# Altium footprint library LimeMicroAltiumLib_pcbLib_r01.PcbLib: 434 footprints (part 20 of 29)
Each footprint in its own frame and in the unit in brackets; x right, y up, seen from the top. Pads: shape width x height; smd on the part's side, far side on the other; paste and mask are expansions set on the pad; w line width, h text height; cw(c..) or ccw(c..) is an arc to the next point about the centre after c.
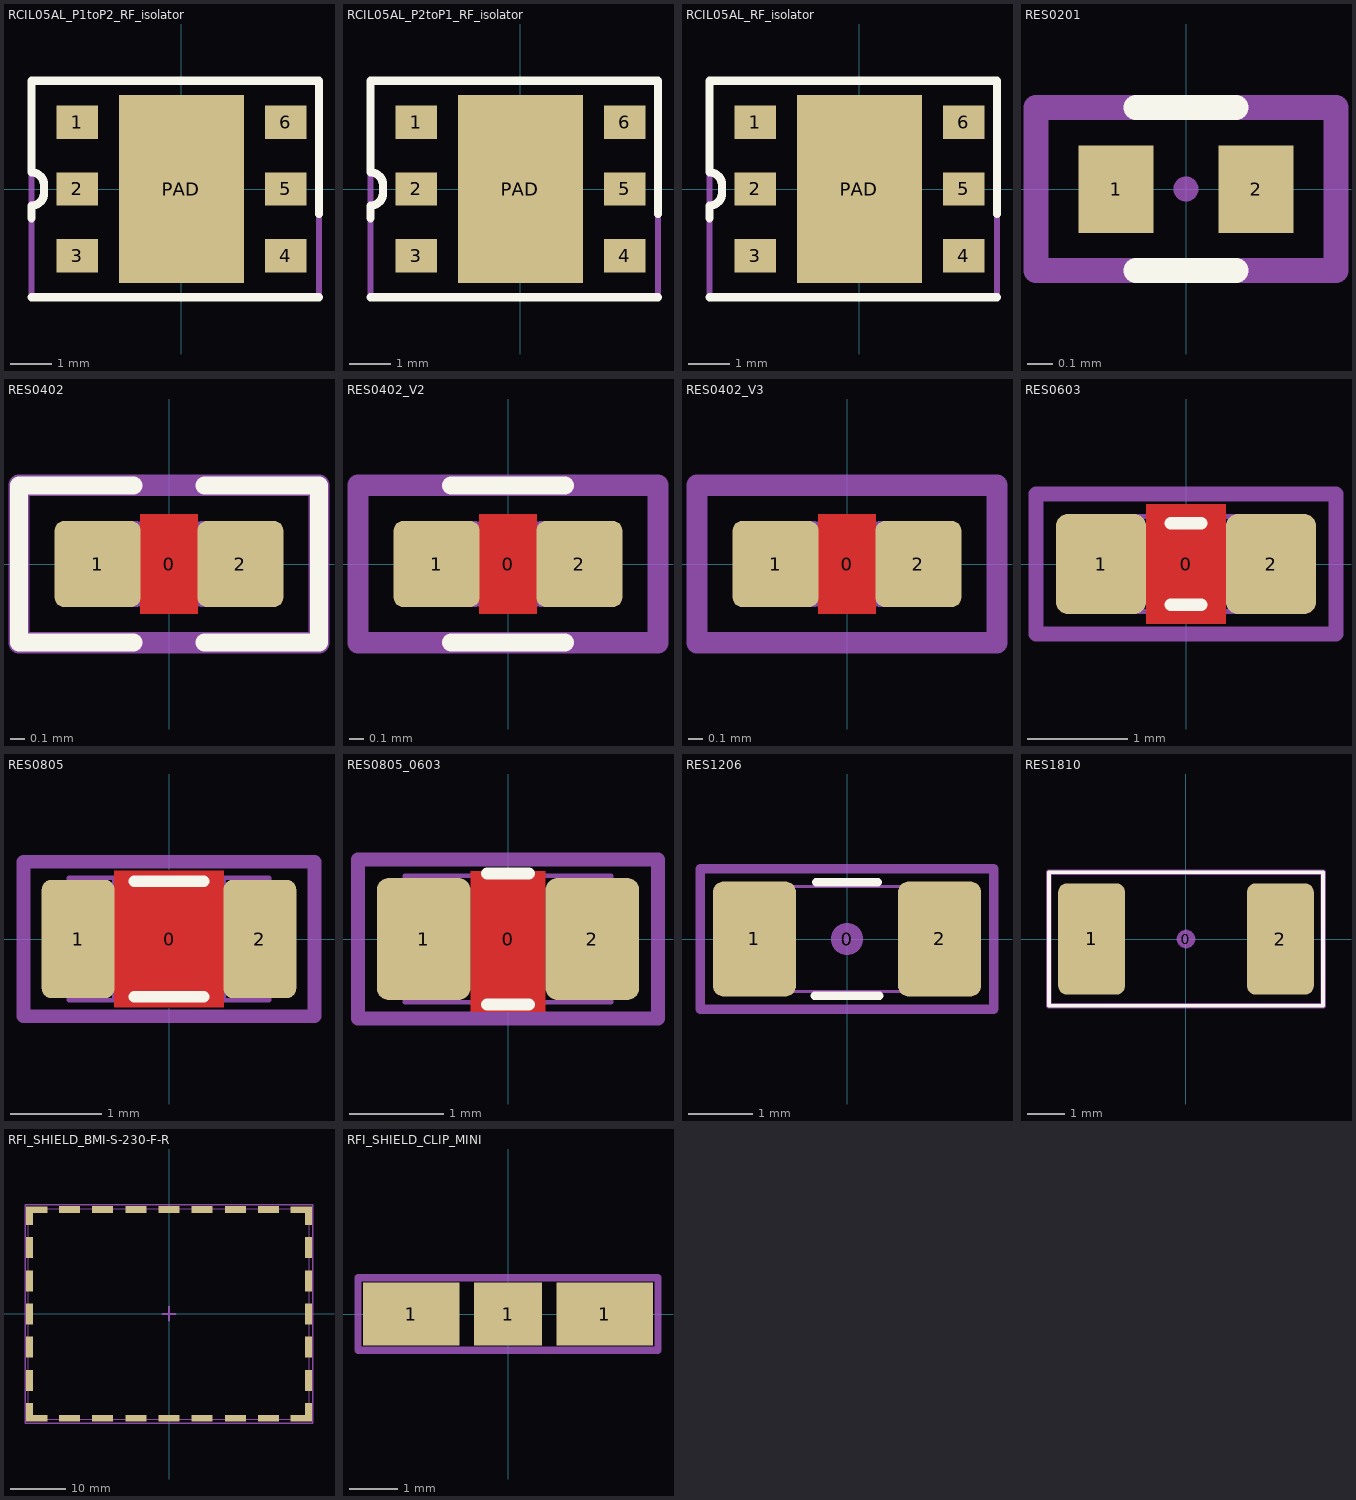
[diagram p19: the footprints below, top view; thin cyan lines are the x and y axes]

## RCIL05AL_P1toP2_RF_isolator [mm]
pads (7):
  rect 1x0.8 smd mask+0.05: 1(-2.5,1.6) 2(-2.5,0) 3(-2.5,-1.6) 4(2.5,-1.6) 5(2.5,0) 6(2.5,1.6)
  rect 3x4.5 smd mask+0.05: PAD(0,0)
Top Overlay:
  lines w0.2: -3.6,-2.6 3.3,-2.6 ; -3.6,-0.7 -3.6,-0.4 ccw(c-3.6,-0.1) -3.3,-0.1 -3.3,0.1 ccw(c-3.6,0.1) -3.6,0.4 -3.6,2.6 3.3,2.6 3.3,-0.6
Mechanical 15:
  lines w0.15: -0.9,-1.5 0.75,-1.5 ; -0.5,0 0.5,0 ; 0,-0.5 0,0.5 ; 0.25,-1.75 0.75,-1.5 ; 0.25,-1.25 0.75,-1.5 ; -3.6,-2.6 -3.6,2.6 3.3,2.6 3.3,-2.6 -3.6,-2.6
  text ".Designator" at 0,0 h0.55
  text "G" at -1.9,1.3 h0.55
  text "G" at -1.9,-0.3 h0.55
  text "P1" at -1.9,-1.8 h0.55
  text "P2" at 1,-1.8 h0.55
  text "G" at 1.5,-0.3 h0.55
  text "G" at 1.5,1.3 h0.55
3D body: height 2.3, standoff 0, extent -2.5,-2.5 2.5,2.5

## RCIL05AL_P2toP1_RF_isolator [mm]
pads (7):
  rect 1x0.8 smd mask+0.05: 1(-2.5,1.6) 2(-2.5,0) 3(-2.5,-1.6) 4(2.5,-1.6) 5(2.5,0) 6(2.5,1.6)
  rect 3x4.5 smd mask+0.05: PAD(0,0)
Top Overlay:
  lines w0.2: -3.6,-2.6 3.3,-2.6 ; -3.6,-0.7 -3.6,-0.4 ccw(c-3.6,-0.1) -3.3,-0.1 -3.3,0.1 ccw(c-3.6,0.1) -3.6,0.4 -3.6,2.6 3.3,2.6 3.3,-0.6
Mechanical 15:
  lines w0.15: -0.5,0 0.5,0 ; -0.4,-1.75 -0.9,-1.5 ; -0.4,-1.25 -0.9,-1.5 ; 0,-0.5 0,0.5 ; 0.75,-1.5 -0.9,-1.5 ; -3.6,-2.6 -3.6,2.6 3.3,2.6 3.3,-2.6 -3.6,-2.6
  text ".Designator" at 0,0 h0.55
  text "G" at -1.9,1.3 h0.55
  text "G" at -1.9,-0.3 h0.55
  text "P1" at -1.9,-1.8 h0.55
  text "P2" at 1,-1.8 h0.55
  text "G" at 1.5,-0.3 h0.55
  text "G" at 1.5,1.3 h0.55
3D body: height 2.3, standoff 0, extent -2.5,-2.575 2.5,2.575

## RCIL05AL_RF_isolator [mm]
pads (7):
  rect 1x0.8 smd mask+0.05: 1(-2.5,1.6) 2(-2.5,0) 3(-2.5,-1.6) 4(2.5,-1.6) 5(2.5,0) 6(2.5,1.6)
  rect 3x4.5 smd mask+0.05: PAD(0,0)
Top Overlay:
  lines w0.2: -3.6,-2.6 3.3,-2.6 ; -3.6,-0.7 -3.6,-0.4 ccw(c-3.6,-0.1) -3.3,-0.1 -3.3,0.1 ccw(c-3.6,0.1) -3.6,0.4 -3.6,2.6 3.3,2.6 3.3,-0.6
Mechanical 15:
  lines w0.15: -0.5,0 0.5,0 ; 0,-0.5 0,0.5 ; -3.6,-2.6 3.3,-2.6 3.3,2.6 -3.6,2.6 -3.6,-2.6
  text "G" at 1.5,1.3 h0.55
  text "G" at 1.5,-0.3 h0.55
  text "P2" at 1,-1.8 h0.55
  text "P1" at -1.9,-1.8 h0.55
  text "G" at -1.9,-0.3 h0.55
  text "G" at -1.9,1.3 h0.55
  text ".Designator" at 0,0 h0.55
3D body: height 2.3, standoff 0, extent -2.5,-2.5 2.5,2.5

## RES0201 [mm]
pads (2):
  rect 0.3x0.35 smd mask+0.05: 1(-0.28,0) 2(0.28,0)
Top Overlay:
  lines w0.1: -0.2,-0.325 0.2,-0.325 ; -0.2,0.325 0.2,0.325
Mechanical 15:
  circle w0.05: c0,0 r0.025
  lines w0.1: -0.6,-0.325 -0.6,0.325 0.6,0.325 0.6,-0.325 -0.6,-0.325
  text ".Designator" at 0.025,0 h0.55
3D body: height 0.25, standoff 0, extent 0.17,-0.15 0.3,0.15
3D body: height 0.25, standoff 0, extent -0.3,-0.15 -0.17,0.15
3D body: height 0.25, standoff 0, extent -0.17,-0.15 0.17,0.15

## RES0402 [mm] "Chip Resistor, Body 1.0x0.5mm, EIA 0402, IPC Medium Density"
height 0.4
pads (3):
  round 0.2 on Mech15: 0(0,0)
  rrect20% 0.6x0.6 smd: 1(-0.5,0) 2(0.5,0)
Top Layer:
  pour cut-out: -0.2,0.35 0.2,0.35 0.2,-0.35 -0.2,-0.35
Top Overlay:
  lines w0.127: -0.25,-0.55 -1.05,-0.55 -1.05,0.55 -0.25,0.55 ; 0.25,-0.55 1.05,-0.55 1.05,0.55 0.25,0.55
Mechanical 13:
  lines w0.05: 0.225,-0.274 -0.225,-0.274 0.225,-0.274 ; -0.525,-0.275 -0.225,-0.275 -0.225,0.275 -0.525,0.275 -0.525,-0.275 ; -0.225,0.274 0.225,0.274 -0.225,0.274 ; 0.225,-0.275 0.225,0.275 0.525,0.275 0.525,-0.275 0.225,-0.275
Mechanical 15:
  lines w0.15: -1.05,-0.55 1.05,-0.55 1.05,0.55 -1.05,0.55 -1.05,-0.55
  text ".Designator" at 0,0 h0.55
3D body "RES 0402 (1005 metric).STEP": height 0.4, standoff 0, extent -0.525,-0.275 0.525,0.275

## RES0402_V2 [mm] "Chip Resistor, Body 1.0x0.5mm, EIA 0402, IPC Medium Density"
height 0.4
pads (3):
  round 0.2 on Mech15: 0(0,0)
  rrect20% 0.6x0.6 smd: 1(-0.5,0) 2(0.5,0)
Top Layer:
  pour cut-out: -0.2,0.35 0.2,0.35 0.2,-0.35 -0.2,-0.35
Top Overlay:
  lines w0.127: -0.4,-0.55 0.4,-0.55 ; -0.4,0.55 0.4,0.55
Mechanical 13:
  lines w0.05: 0.225,-0.274 -0.225,-0.274 0.225,-0.274 ; -0.525,-0.275 -0.225,-0.275 -0.225,0.275 -0.525,0.275 -0.525,-0.275 ; -0.225,0.274 0.225,0.274 -0.225,0.274 ; 0.225,-0.275 0.225,0.275 0.525,0.275 0.525,-0.275 0.225,-0.275
Mechanical 15:
  lines w0.15: -1.05,-0.55 1.05,-0.55 1.05,0.55 -1.05,0.55 -1.05,-0.55
  text ".Designator" at 0,0 h0.55
3D body "RES 0402 (1005 metric).STEP": height 0.4, standoff 0, extent -0.525,-0.275 0.525,0.275

## RES0402_V3 [mm] "Chip Resistor, Body 1.0x0.5mm, EIA 0402, IPC Medium Density"
height 0.4
pads (3):
  round 0.2 on Mech15: 0(0,0)
  rrect20% 0.6x0.6 smd: 1(-0.5,0) 2(0.5,0)
Top Layer:
  pour cut-out: -0.2,0.35 0.2,0.35 0.2,-0.35 -0.2,-0.35
Mechanical 13:
  lines w0.05: 0.225,-0.274 -0.225,-0.274 0.225,-0.274 ; -0.525,-0.275 -0.525,0.275 -0.225,0.275 -0.225,-0.275 -0.525,-0.275 ; -0.225,0.274 0.225,0.274 -0.225,0.274 ; 0.225,-0.275 0.525,-0.275 0.525,0.275 0.225,0.275 0.225,-0.275
Mechanical 15:
  lines w0.15: -1.05,-0.55 -1.05,0.55 1.05,0.55 1.05,-0.55 -1.05,-0.55
  text ".Designator" at 0,0 h0.55
3D body "RES 0402 (1005 metric).STEP": height 0.4, standoff 0, extent -0.525,-0.275 0.525,0.275

## RES0603 [mm] "Chip Resistor, Body 1.6x0.8mm, 0603, IPC Medium Density"
height 0.55
pads (3):
  round 0.254 on Mech15: 0(0,0)
  rrect25% 0.9x1 smd: 1(-0.85,0) 2(0.85,0)
Top Layer:
  pour cut-out: -0.4,0.6 0.4,0.6 0.4,-0.6 -0.4,-0.6
Top Overlay:
  lines w0.127: -0.152,-0.406 0.152,-0.406 ; -0.152,0.406 0.152,0.406
Mechanical 13:
  lines w0.05: -0.875,-0.475 -0.875,0.475 -0.475,0.475 -0.475,-0.475 -0.875,-0.475 ; -0.475,-0.474 0.475,-0.474 -0.475,-0.474 ; -0.475,0.474 0.475,0.474 -0.475,0.474 ; 0.475,-0.475 0.875,-0.475 0.875,0.475 0.475,0.475 0.475,-0.475
Mechanical 15:
  lines w0.15: -1.5,-0.7 1.5,-0.7 1.5,0.7 -1.5,0.7 -1.5,-0.7
  text ".Designator" at 0,0 h0.55
3D body "RES 0603 (1608 metric).STEP": height 0.54, standoff -0.01, extent -0.875,-0.475 0.875,0.475

## RES0805 [mm] "Chip Resistor, Body 2.0x1.2mm, 0805, IPC Medium Density"
height 0.7
pads (3):
  round 0.254 on Mech15: 0(0,0)
  rrect25% 0.8x1.3 smd: 1(-1,0) 2(1,0)
Top Layer:
  pour cut-out: -0.6,0.75 0.6,0.75 0.6,-0.75 -0.6,-0.75
Top Overlay:
  lines w0.127: -0.381,-0.635 0.381,-0.635 ; -0.381,0.635 0.381,0.635
Mechanical 13:
  lines w0.05: 0.6,-0.674 -0.6,-0.674 ; -0.6,-0.674 0.6,-0.674 ; -0.6,-0.675 -1.1,-0.675 -1.1,0.675 -0.6,0.675 -0.6,-0.675 ; 0.6,-0.675 1.1,-0.675 1.1,0.675 0.6,0.675 ; 0.6,-0.675 0.6,0.675 ; 0.6,0.674 -0.6,0.674 0.6,0.674
Mechanical 15:
  lines w0.15: -1.6,-0.85 -1.6,0.85 1.6,0.85 1.6,-0.85 -1.6,-0.85
  text ".Designator" at 0,0 h0.55
3D body "RES 0805 (2012 metric).STEP": height 0.69, standoff -0.01, extent -1.1,-0.675 1.1,0.675

## RES0805_0603 [mm] "Universal 0805 0603 footprint"
height 0.7
pads (3):
  round 0.254 on Mech15: 0(0,0)
  rrect25% 1x1.3 smd: 1(-0.9,0) 2(0.9,0)
Top Layer:
  pour cut-out: -0.4,0.725 0.4,0.725 0.4,-0.775 -0.4,-0.775
Top Overlay:
  lines w0.127: -0.225,-0.7 0.225,-0.7 ; -0.225,0.7 0.225,0.7
Mechanical 13:
  lines w0.05: 0.6,-0.674 -0.6,-0.674 ; -0.6,-0.674 0.6,-0.674 ; -0.6,-0.675 -1.1,-0.675 -1.1,0.675 -0.6,0.675 -0.6,-0.675 ; 0.6,-0.675 1.1,-0.675 1.1,0.675 0.6,0.675 ; 0.6,-0.675 0.6,0.675 ; 0.6,0.674 -0.6,0.674 0.6,0.674
Mechanical 15:
  lines w0.15: -1.6,-0.85 -1.6,0.85 1.6,0.85 1.6,-0.85 -1.6,-0.85
  text ".Designator" at 0,0 h0.55
3D body "RES 0805 (2012 metric).STEP": height 0.69, standoff -0.01, extent -1.1,-0.675 1.1,0.675

## RES1206 [mm] "Chip Resistor, Body 3.2x1.6mm, 1206, IPC Medium Density"
height 0.7
pads (3):
  round 0.508 on Mech15: 0(0,0)
  rrect25% 1.3x1.8 smd: 1(-1.45,0) 2(1.45,0)
Top Overlay:
  lines w0.127: -0.508,-0.889 0.508,-0.889 ; -0.483,0.889 0.483,0.889
Mechanical 13:
  lines w0.05: 1.025,-0.824 -1.025,-0.824 1.025,-0.824 ; -1.625,-0.825 -1.625,0.825 -1.025,0.825 -1.025,-0.825 -1.625,-0.825 ; -1.025,0.824 1.025,0.824 -1.025,0.824 ; 1.025,-0.825 1.625,-0.825 1.625,0.825 1.025,0.825 1.025,-0.825
Mechanical 15:
  lines w0.15: -2.3,-1.1 2.3,-1.1 2.3,1.1 -2.3,1.1 -2.3,-1.1
  text ".Designator" at 0,0 h0.55
3D body "RES 1206 (3216 metric).STEP": height 0.69, standoff -0.01, extent -1.625,-0.825 1.625,0.825

## RES1810 [mm]
height 0.7
pads (3):
  round 0.508 on Mech15: 0(0,0)
  rrect25% 1.8x3 smd: 1(-2.55,0) 2(2.55,0)
Top Overlay:
  lines w0.1: -3.7,-1.8 3.7,-1.8 3.7,1.8 -3.7,1.8 -3.7,-1.8
Mechanical 15:
  lines w0.15: -3.7,-1.8 -3.7,1.8 3.7,1.8 3.7,-1.8 -3.7,-1.8
  text ".Designator" at 0,0 h0.55
3D body: height 2.55, standoff 0, extent -2.3,-1.3 -1.4,1.3
3D body: height 2.5, standoff 0, extent -2.25,-1.25 2.25,1.25
3D body: height 2.55, standoff 0, extent 1.4,-1.3 2.3,1.3

## RFI_SHIELD_21.2x21.2 [mm] "RFI SHIELD 36003200"
height 3
3D body: height 3, standoff 0, extent 0.225,21.55 21.538,22.075
3D body: height 3, standoff 0, extent 21.538,-0.25 22.063,22.075
3D body: height 3, standoff 0, extent -0.3,-0.25 0.225,22.075
3D body: height 3, standoff 0, extent 0.225,-0.25 21.538,0.275
3D body: height 3, standoff 2.9, extent 0.225,0.275 21.538,21.55

## RFI_SHIELD_28x42 [mm] "RFI SHIELD SMS-459C"
height 3
3D body: height 3, standoff 0, extent 0.525,41.813 27.788,42.338
3D body: height 3, standoff 0, extent 27.788,0 28.313,42.338
3D body: height 3, standoff 0, extent 0,0 0.525,42.338
3D body: height 3, standoff 0, extent 0.525,0 27.788,0.525
3D body: height 3, standoff 2.9, extent 0.525,0.525 27.788,41.813

## RFI_SHIELD_BMI-S-230-F-R [mm]
pads (32):
  rect 1.2x3.35 smd mask+0.05: 1(-25.2,-17.787) 1(-25.2,17.762) 1(25.2,-17.787) 1(25.2,17.762)
  rect 1.2x3.8 smd mask+0.05: 1(-25.2,-12.013) 1(-25.2,-6.013) 1(-25.2,-0.012) 1(-25.2,5.988) 1(-25.2,11.988) 1(25.2,-12.013) 1(25.2,-6.013) 1(25.2,-0.012) 1(25.2,5.988) 1(25.2,11.988)
  rect 3.85x1.2 smd mask+0.05: 1(-23.875,-18.862) 1(-23.875,18.838) 1(23.875,-18.862) 1(23.875,18.838)
  rect 3.8x1.2 smd mask+0.05: 1(-18,-18.837) 1(-18,18.863) 1(-12,-18.837) 1(-12,18.863) 1(-6,-18.837) 1(-6,18.863) 1(0,-18.837) 1(0,18.863) 1(6,-18.837) 1(6,18.863) 1(12,-18.837) 1(12,18.863) 1(18,-18.837) 1(18,18.863)
Mechanical 13:
  lines w0.15: -25.425,-19.062 -25.425,19.037 25.375,19.037 25.375,-19.062 -25.425,-19.062 ; -17.65,-19.062 -17.65,-19.063
Mechanical 15:
  lines w0.3: -1.25,0 1.25,0 ; 0,-1.25 0,1.25 ; -26,-19.75 -26,19.75 26,19.75 26,-19.75 -26,-19.75
  text "RF shield (frame + cover)" at -8.25,-19 h0.55
  text ".Designator" at 0,0 h0.55
3D body "Masach Technologies-MS511-20.STEP": height 6.6, standoff -0.8, extent -26.15,-19.8 26.15,19.8

## RFI_SHIELD_CLIP_MINI [mm] "RFI SHIELD CLIP MINI TIN SMD, S0971-46R"
pads (3):
  rect 2x1.3 smd mask+0.05: 1(-2,0) 1(2,0)
  rect 1.4x1.3 smd mask+0.05: 1(0,0)
Mechanical 15:
  lines w0.15: -0.2,0 0,0 ; 0,-0.2 0,0 ; 0,0.2 0,0 ; 0.2,0 0,0 ; -3.1,-0.75 3.1,-0.75 3.1,0.75 -3.1,0.75 -3.1,-0.75
  text ".Designator" at 0,0 h0.55
3D body: height 1, standoff 0, extent 0.7,-0.5 2.6,-0.4
3D body: height 1, standoff 0, extent 0.7,0.4 2.6,0.5
3D body: height 1, standoff 0, extent -2.6,0.4 -0.7,0.5
3D body: height 0.2, standoff 0, extent -2.9,-0.5 2.9,0.5
3D body: height 1, standoff 0, extent -2.6,-0.5 -0.7,-0.4